# Altium footprint library ALTİUM_PROJE.PcbLib1.PcbLib: 38 footprints (part 3 of 3)
Each footprint in its own frame and in the unit in brackets; x right, y up, seen from the top. Pads: shape width x height; smd on the part's side, far side on the other; paste and mask are expansions set on the pad; w line width, h text height; cw(c..) or ccw(c..) is an arc to the next point about the centre after c.
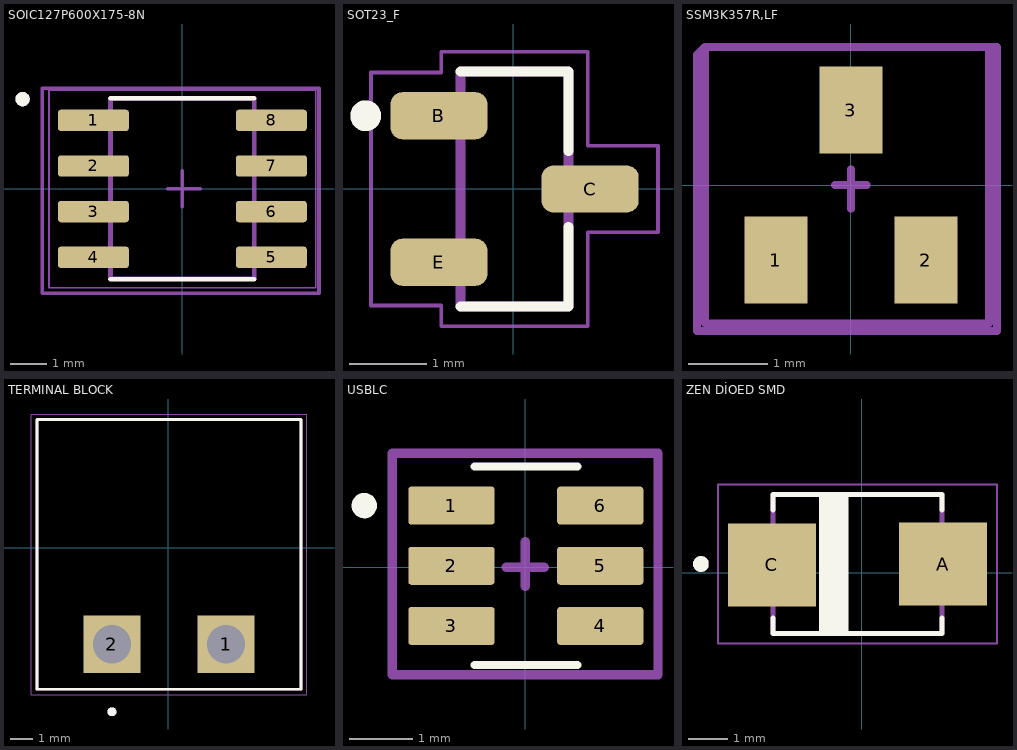
[diagram p2: the footprints below, top view; thin cyan lines are the x and y axes]

## SOIC127P600X175-8N [mm]
pads (8):
  rrect25% 1.97x0.59 smd: 1(-2.475,1.905) 2(-2.475,0.635) 3(-2.475,-0.635) 4(-2.475,-1.905) 5(2.475,-1.905) 6(2.475,-0.635) 7(2.475,0.635) 8(2.475,1.905)
Top Overlay:
  circle w0.2: c-4.445,2.495 r0.1
  lines w0.127: -2,-2.52 2,-2.52 ; -2,2.52 2,2.52
Top Component Center:
  lines w0.1: -0.4,0 0.5,0 ; 0,-0.5 0,0.5 ; -3.9,-2.9 -3.9,2.8 3.8,2.8 3.8,-2.9 -3.9,-2.9
Top Designator:
  lines w0.1: -3.9,-2.9 3.8,-2.9 3.8,2.8 -3.9,2.8 -3.9,-2.9
  text "Designator" at 0.3,0.333 h1
Mechanical 13:
  circle w0.2: c-4.445,2.495 r0.1
  lines w0.127: -2,-2.5 -2,2.5 2,2.5 2,-2.5 -2,-2.5
Mechanical 15:
  lines w0.05: -3.71,-2.75 -3.71,2.75 3.71,2.75 3.71,-2.75 -3.71,-2.75
3D body "MAX6662MSA+.STEP": height 1.75, standoff 0, extent -3,-2.45 3,2.45

## SOT23_F [mm]
pads (3):
  rrect50% 1.26x0.61 smd: B(-0.96,0.945) C(1,-0.005) E(-0.96,-0.955)
Top Overlay:
  circle w0.2: c-1.91,0.945 r0.1
  lines w0.127: -0.68,-1.53 0.72,-1.53 0.72,-0.493 ; -0.68,1.52 0.72,1.52 0.72,0.484
Mechanical 13:
  lines w0.127: -0.68,-1.53 -0.68,1.52 0.72,1.52 0.72,-1.53 -0.68,-1.53
Mechanical 15:
  lines w0.05: -1.84,-1.515 -1.84,1.505 -0.93,1.505 -0.93,1.775 0.97,1.775 0.97,0.555 1.88,0.555 1.88,-0.565 0.97,-0.565 0.97,-1.785 -0.93,-1.785 -0.93,-1.515 -1.84,-1.515
3D body "User Library-SOT23-3.step": height 1.3, standoff 0, extent -1.476,-1.45 1.324,1.45

## SSM3K357R,LF [mm]
pads (3):
  rect 0.8x1.1 smd mask+0.05: 1(-0.95,-0.95) 2(0.95,-0.95) 3(0,0.95)
Top Component Center:
  lines w0.1: -0.2,0 0.2,0 ; 0,-0.3 0,0.2 ; -1.85,-1.75 1.75,-1.75 1.75,1.75 -1.45,1.75 -1.85,1.75 -1.85,-1.75
Top Designator:
  lines w0.1: -1.95,-1.85 1.85,-1.85 1.85,1.75 -1.85,1.75 -1.95,1.65 -1.95,-1.85
  text "DESİGNER" at 0.2,-0.3 h1
3D body "CircuitWorks-SOT-23.step": height 1.1, standoff 0, extent -1.45,-1.3 1.55,1.2

## TERMINAL BLOCK [mm]
pads (2):
  rect 2.55x2.55 hole 1.7 square mask+0.05: 1(2.565,-4.293) 2(-2.515,-4.293)
Top Overlay:
  circle w0.2: c-2.515,-7.293 r0.1
  lines w0.127: -5.855,-6.293 5.905,-6.293 5.905,5.707 -5.855,5.707 -5.855,-6.293
Mechanical 13:
  circle w0.2: c-2.515,-7.293 r0.1
  lines w0.127: -5.855,-6.293 5.905,-6.293 5.905,5.707 -5.855,5.707 -5.855,-6.293
Mechanical 15:
  lines w0.05: -6.105,-6.543 -6.105,5.957 6.155,5.957 6.155,-6.543 -6.105,-6.543
3D body "CUI_DEVICES_TBP01R1-508-02BE.step": height 8.5, standoff -4, extent -5.944,-6.229 5.816,5.771

## USBLC [mm]
pads (6):
  rrect15% 1.36x0.6 smd mask+0.05: 1(-1.162,0.972) 2(-1.162,0.022) 3(-1.162,-0.928) 4(1.188,-0.928) 5(1.188,0.022) 6(1.188,0.972)
Top Overlay:
  circle w0.2: c-2.537,0.972 r0.1
  lines w0.127: -0.8,-1.548 0.826,-1.548 ; -0.8,1.592 0.826,1.592
Top Component Center:
  lines w0.15: -0.3,0 0.3,0 ; 0,-0.3 0,0.4 ; -2.1,-1.7 2.1,-1.7 2.1,1.8 -2.1,1.8 -2.1,-1.7
Top Designator:
  lines w0.15: -2.1,-1.7 2.1,-1.7 2.1,1.8 -2.1,1.8 -2.1,-1.7
3D body "USBLC6-2SC6.STEP": height 1.4, standoff -0.05, extent -1.4,-1.462 1.4,1.462

## ZEN DİOED SMD [mm]
pads (2):
  rect 2.25x2.12 smd mask+0.05: A(2.072,0.225) C(-2.3,0.2)
Top Overlay:
  circle w0.2: c-4.113,0.225 r0.1
  rectangle: -1.1,-1.55 -0.35,2
  lines w0.127: -2.273,-1.149 -2.273,-1.555 2.047,-1.555 2.047,-1.149 ; -2.273,1.599 -2.273,2.005 2.047,2.005 2.047,1.599
Mechanical 13:
  circle w0.2: c-4.113,0.225 r0.1
  lines w0.127: -2.273,-1.555 2.047,-1.555 2.047,2.005 -2.273,2.005 -2.273,-1.555
Mechanical 15:
  lines w0.05: -3.673,-1.805 -3.673,2.255 3.447,2.255 3.447,-1.805 -3.673,-1.805
3D body "1SMB5919BT3G (1).STEP": height 2.49, standoff 0.02, extent -2.62,-1.58 2.82,1.98